# Altium footprint library PcbLib.PcbLib: 428 footprints (part 12 of 27)
Each footprint in its own frame and in the unit in brackets; x right, y up, seen from the top. Pads: shape width x height; smd on the part's side, far side on the other; paste and mask are expansions set on the pad; w line width, h text height; cw(c..) or ccw(c..) is an arc to the next point about the centre after c.
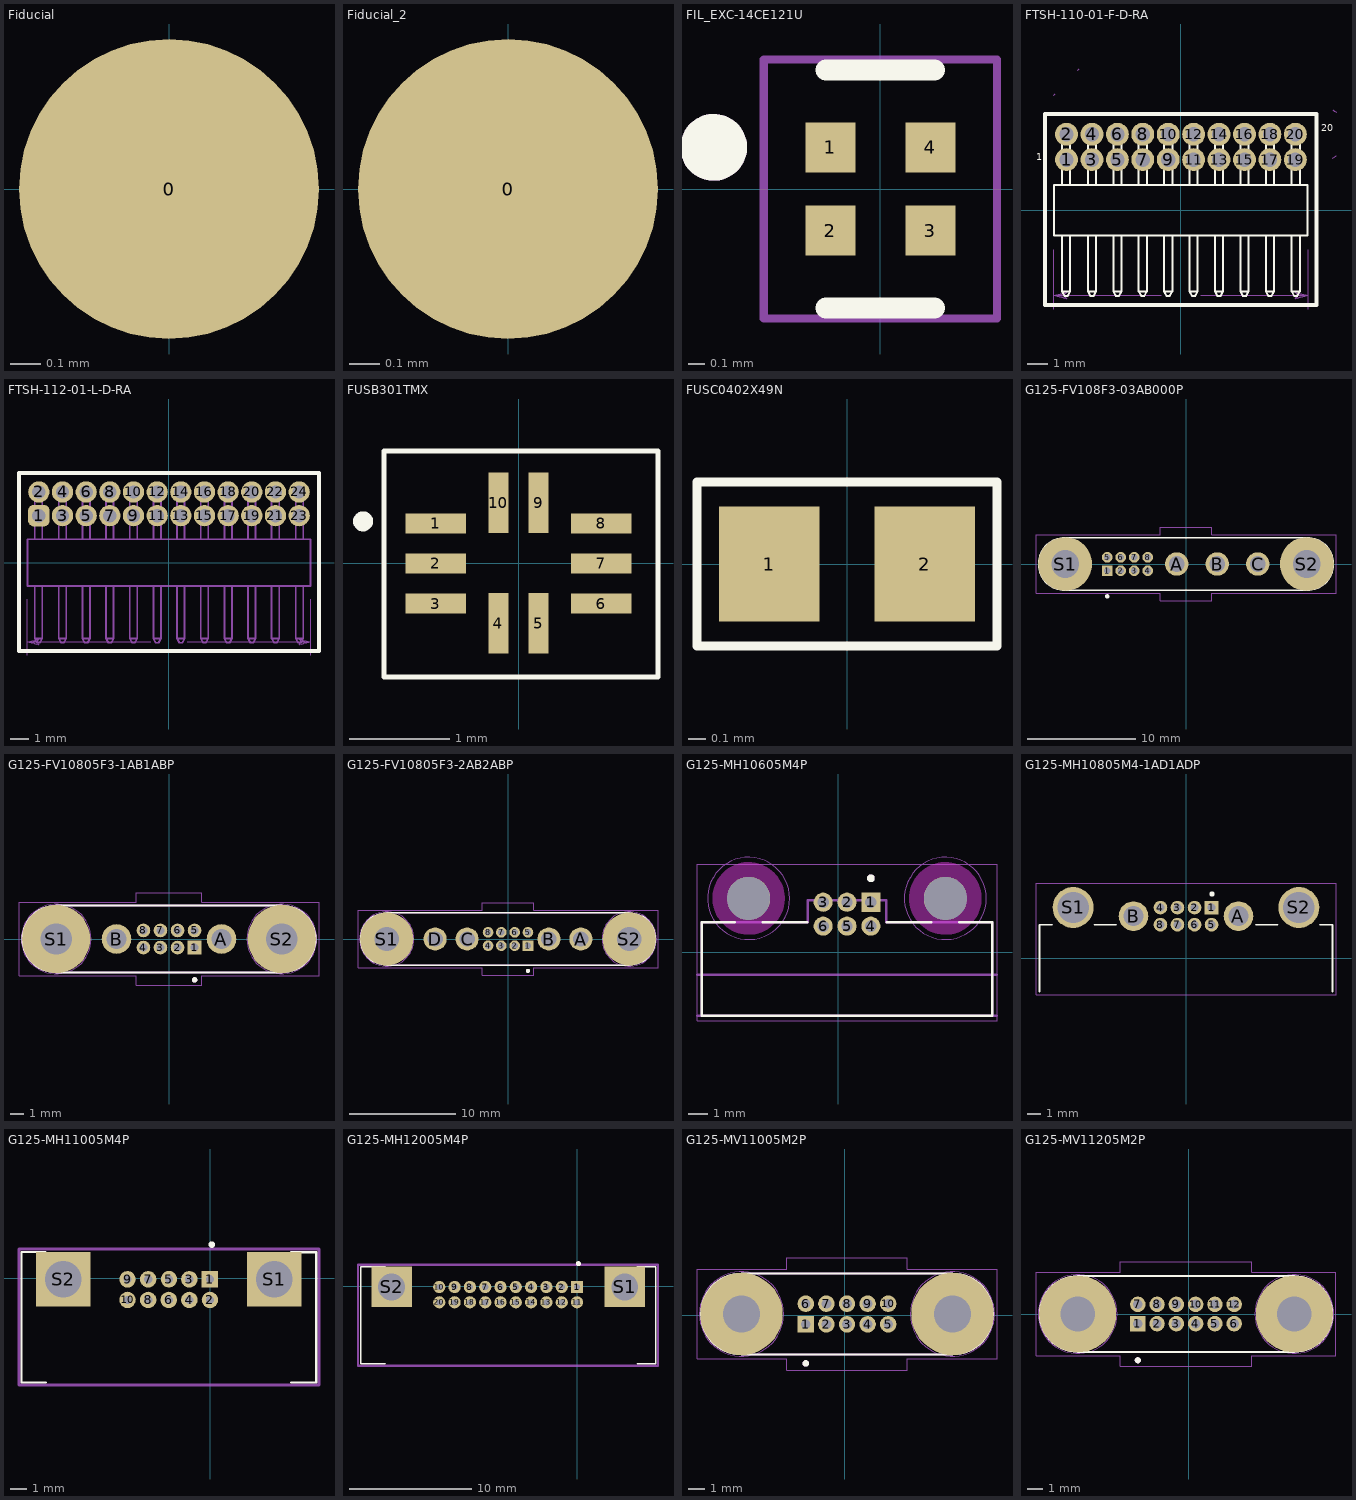
[diagram p11: the footprints below, top view; thin cyan lines are the x and y axes]

## Fiducial [mm]
pads (1):
  round 1 smd mask+0.2: 0(0,0)

## Fiducial_2 [mm]
pads (1):
  round 1 smd mask+0.5: 0(0,0)

## FIL_EXC-14CE121U [mm]
pads (4):
  rect 0.3x0.3 smd: 1(-0.3,0.25) 2(-0.3,-0.25) 3(0.3,-0.25) 4(0.3,0.25)
Top Overlay:
  circle w0.2: c-1,0.25 r0.1
  lines w0.127: -0.325,-0.714 0.325,-0.714 ; -0.325,0.714 0.325,0.714
Mechanical 13:
  circle w0.2: c-1,0.25 r0.1
Mechanical 15:
  lines w0.05: -0.7,-0.777 0.7,-0.777 0.7,0.777 -0.7,0.777 -0.7,-0.777
3D body "step_temp.STEP": height 0.5, standoff 0, extent -0.325,-0.425 0.325,0.425

## FTSH-110-01-F-D-RA [mil]
pads (20):
  round 45 hole 27.95: 1(-225,99.49) 2(-225,149.49) 3(-175,99.49) 4(-175,149.49) 5(-125,99.49) 6(-125,149.49) 7(-75,99.49) 8(-75,149.49) 9(-25,99.49) 10(-25,149.49) 11(25,99.49) 12(25,149.49) 13(75,99.49) 14(75,149.49) 15(125,99.49) 16(125,149.49) 17(175,99.49) 18(175,149.49) 19(225,99.49) 20(225,149.49)
Top Overlay:
  lines w3.94: -233.7,-49.49 -233.7,-160 ; -233.7,49.49 -233.7,157.99 -217.72,157.99 -217.72,49.49 ; -217.72,-49.49 -217.72,-160 ; -200.71,-49.49 -249.21,-49.49 -249.21,49.49 -200.71,49.49 ; -200,-49.49 -150,-49.49 -100,-49.49 -50,-49.49 0,-49.49 50,-49.49 100,-49.49 150,-49.49 200,-49.49 ; -200,49.49 -150,49.49 -100,49.49 -50,49.49 0,49.49 50,49.49 100,49.49 150,49.49 200,49.49 ; -182.99,-49.49 -182.99,-160 ; -182.99,49.49 -182.99,157.99 -167.01,157.99 -167.01,49.49 ; -167.01,-49.49 -167.01,-160 ; -132.99,-49.49 -132.99,-160 ; -132.99,49.49 -132.99,157.99 -117.01,157.99 -117.01,49.49 ; -117.01,-49.49 -117.01,-160 ; -82.99,-49.49 -82.99,-160 ; -82.99,49.49 -82.99,157.99 -67.01,157.99 -67.01,49.49 ; -67.01,-49.49 -67.01,-160 ; -32.99,-49.49 -32.99,-160 ; -32.99,49.49 -32.99,157.99 -17.01,157.99 -17.01,49.49 ; -17.01,-49.49 -17.01,-160 ; 17.01,-49.49 17.01,-160 ; 17.01,49.49 17.01,157.99 32.99,157.99 32.99,49.49 ; 32.99,-49.49 32.99,-160 ; 67.01,-49.49 67.01,-160 ; 67.01,49.49 67.01,157.99 82.99,157.99 82.99,49.49 ; 82.99,-49.49 82.99,-160 ; 117.01,-49.49 117.01,-160 ; 117.01,49.49 117.01,157.99 132.99,157.99 132.99,49.49 ; 132.99,-49.49 132.99,-160 ; 167.01,-49.49 167.01,-160 ; 167.01,49.49 167.01,157.99 182.99,157.99 182.99,49.49 ; 182.99,-49.49 182.99,-160 ; 200.79,-49.49 249.29,-49.49 249.29,49.49 200.79,49.49 ; 217.8,-49.49 217.8,-160 ; 217.8,49.49 217.8,157.99 233.82,157.99 233.82,49.49 ; 233.82,-49.49 233.82,-160 ; -233.7,-160 -228.5,-169.02 -222.91,-169.02 -217.72,-160 ; -233.7,-160 -217.72,-160 ; -182.99,-160 -177.8,-169.02 -172.2,-169.02 -167.01,-160 ; -182.99,-160 -167.01,-160 ; -132.99,-160 -127.8,-169.02 -122.2,-169.02 -117.01,-160 ; -132.99,-160 -117.01,-160 ; -82.99,-160 -77.8,-169.02 -72.2,-169.02 -67.01,-160 ; -82.99,-160 -67.01,-160 ; -32.99,-160 -27.8,-169.02 -22.2,-169.02 -17.01,-160 ; -32.99,-160 -17.01,-160 ; 17.01,-160 22.2,-169.02 27.8,-169.02 32.99,-160 ; 17.01,-160 32.99,-160 ; 67.01,-160 72.2,-169.02 77.8,-169.02 82.99,-160 ; 67.01,-160 82.99,-160 ; 117.01,-160 122.2,-169.02 127.8,-169.02 132.99,-160 ; 117.01,-160 132.99,-160 ; 167.01,-160 172.2,-169.02 177.8,-169.02 182.99,-160 ; 167.01,-160 182.99,-160 ; 217.8,-160 222.99,-169.02 228.58,-169.02 233.82,-160 ; 217.8,-160 233.82,-160
  lines w7.87: -266.93,-186.73 -266.93,189.76 267.01,189.76 267.01,-186.73 -266.93,-186.73
  text "20" at 276,150 h23.62
  text "1" at -285,93 h23.62
Mechanical 40:
  lines w0: -250,-195.12 -250,-77.6 ; -250,226.26 -247.48,229.37 ; -202.52,275.63 -200,278.74 ; -39.02,-167.48 -250,-167.48 ; 39.02,-167.48 250,-167.48 ; 250,-195.12 250,-77.6 ; 298.74,102.52 305,107.48 301.89,105 ; 301.89,195 298.74,197.48 305,192.52 ; -250,-167.48 -225,-161.26 ; -250,-167.48 -225,-173.74 -230,-167.48 ; -250,-167.48 -227.48,-170.63 -230,-167.48 ; -250,-167.48 -230,-167.48 ; -250,-167.48 -227.48,-164.37 -225,-161.26 ; -230,-167.48 -225,-161.26 ; 225,-173.74 250,-167.48 ; 225,-173.74 230,-167.48 ; 225,-173.74 227.48,-170.63 250,-167.48 ; 230,-167.48 225,-161.26 250,-167.48 ; 230,-167.48 227.48,-164.37 250,-167.48 ; 230,-167.48 250,-167.48
  text "12.700" at -31.5,-172.52 h15.5
3D body "FTSH-110-01-F-D-RA--3DModel-STEP-56544.STEP": height 142.3, standoff -82.7, extent -251,-170 249,157

## FTSH-112-01-L-D-RA [mil]
pads (24):
  rrect50% 45x45 hole 27.95: 1(-275,99.49)
  round 45 hole 27.95: 2(-275,149.49) 3(-225,99.49) 4(-225,149.49) 5(-175,99.49) 6(-175,149.49) 7(-125,99.49) 8(-125,149.49) 9(-75,99.49) 10(-75,149.49) 11(-25,99.49) 12(-25,149.49) 13(25,99.49) 14(25,149.49) 15(75,99.49) 16(75,149.49) 17(125,99.49) 18(125,149.49) 19(175,99.49) 20(175,149.49) 21(225,99.49) 22(225,149.49) 23(275,99.49) 24(275,149.49)
Top Overlay:
  lines w7.87: -316.93,-186.73 317.01,-186.73 317.01,189.76 -316.93,189.76 -316.93,-186.73
Top Solder:
  circle w0: c275,149.49 r24.49
  circle w0: c275,99.49 r24.49
  circle w0: c225,149.49 r24.49
  circle w0: c225,99.49 r24.49
  circle w0: c175,149.49 r24.49
  circle w0: c175,99.49 r24.49
  circle w0: c125,149.49 r24.49
  circle w0: c125,99.49 r24.49
  circle w0: c75,149.49 r24.49
  circle w0: c75,99.49 r24.49
  circle w0: c25,149.49 r24.49
  circle w0: c25,99.49 r24.49
  circle w0: c-25,149.49 r24.49
  circle w0: c-25,99.49 r24.49
  circle w0: c-75,149.49 r24.49
  circle w0: c-75,99.49 r24.49
  circle w0: c-125,149.49 r24.49
  circle w0: c-125,99.49 r24.49
  circle w0: c-175,149.49 r24.49
  circle w0: c-175,99.49 r24.49
  circle w0: c-225,149.49 r24.49
  circle w0: c-225,99.49 r24.49
  circle w0: c-275,149.49 r24.49
  circle w0: c-275,99.49 r24.49
Bottom Solder:
  circle w0: c275,149.49 r24.49
  circle w0: c275,99.49 r24.49
  circle w0: c225,149.49 r24.49
  circle w0: c225,99.49 r24.49
  circle w0: c175,149.49 r24.49
  circle w0: c175,99.49 r24.49
  circle w0: c125,149.49 r24.49
  circle w0: c125,99.49 r24.49
  circle w0: c75,149.49 r24.49
  circle w0: c75,99.49 r24.49
  circle w0: c25,149.49 r24.49
  circle w0: c25,99.49 r24.49
  circle w0: c-25,149.49 r24.49
  circle w0: c-25,99.49 r24.49
  circle w0: c-75,149.49 r24.49
  circle w0: c-75,99.49 r24.49
  circle w0: c-125,149.49 r24.49
  circle w0: c-125,99.49 r24.49
  circle w0: c-175,149.49 r24.49
  circle w0: c-175,99.49 r24.49
  circle w0: c-225,149.49 r24.49
  circle w0: c-225,99.49 r24.49
  circle w0: c-275,149.49 r24.49
  circle w0: c-275,99.49 r24.49
Mechanical 16:
  lines w3.94: -283.7,-49.49 -283.7,-160 ; -283.7,49.49 -283.7,157.99 -267.72,157.99 -267.72,49.49 ; -267.72,-49.49 -267.72,-160 ; -250.71,-49.49 -299.21,-49.49 -299.21,49.49 -250.71,49.49 ; -250,-49.49 -200,-49.49 -150,-49.49 -100,-49.49 -50,-49.49 0,-49.49 50,-49.49 100,-49.49 150,-49.49 200,-49.49 250,-49.49 ; -250,49.49 -200,49.49 -150,49.49 -100,49.49 -50,49.49 0,49.49 50,49.49 100,49.49 150,49.49 200,49.49 250,49.49 ; -232.99,-49.49 -232.99,-160 ; -232.99,49.49 -232.99,157.99 -217.01,157.99 -217.01,49.49 ; -217.01,-49.49 -217.01,-160 ; -182.99,-49.49 -182.99,-160 ; -182.99,49.49 -182.99,157.99 -167.01,157.99 -167.01,49.49 ; -167.01,-49.49 -167.01,-160 ; -132.99,-49.49 -132.99,-160 ; -132.99,49.49 -132.99,157.99 -117.01,157.99 -117.01,49.49 ; -117.01,-49.49 -117.01,-160 ; -82.99,-49.49 -82.99,-160 ; -82.99,49.49 -82.99,157.99 -67.01,157.99 -67.01,49.49 ; -67.01,-49.49 -67.01,-160 ; -32.99,-49.49 -32.99,-160 ; -32.99,49.49 -32.99,157.99 -17.01,157.99 -17.01,49.49 ; -17.01,-49.49 -17.01,-160 ; 17.01,-49.49 17.01,-160 ; 17.01,49.49 17.01,157.99 32.99,157.99 32.99,49.49 ; 32.99,-49.49 32.99,-160 ; 67.01,-49.49 67.01,-160 ; 67.01,49.49 67.01,157.99 82.99,157.99 82.99,49.49 ; 82.99,-49.49 82.99,-160 ; 117.01,-49.49 117.01,-160 ; 117.01,49.49 117.01,157.99 132.99,157.99 132.99,49.49 ; 132.99,-49.49 132.99,-160 ; 167.01,-49.49 167.01,-160 ; 167.01,49.49 167.01,157.99 182.99,157.99 182.99,49.49 ; 182.99,-49.49 182.99,-160 ; 217.01,-49.49 217.01,-160 ; 217.01,49.49 217.01,157.99 232.99,157.99 232.99,49.49 ; 232.99,-49.49 232.99,-160 ; 250.79,-49.49 299.29,-49.49 299.29,49.49 250.79,49.49 ; 267.8,-49.49 267.8,-160 ; 267.8,49.49 267.8,157.99 283.82,157.99 283.82,49.49 ; 283.82,-49.49 283.82,-160 ; -283.7,-160 -278.5,-169.02 -272.91,-169.02 -267.72,-160 ; -283.7,-160 -267.72,-160 ; -232.99,-160 -227.8,-169.02 -222.2,-169.02 -217.01,-160 ; -232.99,-160 -217.01,-160 ; -182.99,-160 -177.8,-169.02 -172.2,-169.02 -167.01,-160 ; -182.99,-160 -167.01,-160 ; -132.99,-160 -127.8,-169.02 -122.2,-169.02 -117.01,-160 ; -132.99,-160 -117.01,-160 ; -82.99,-160 -77.8,-169.02 -72.2,-169.02 -67.01,-160 ; -82.99,-160 -67.01,-160 ; -32.99,-160 -27.8,-169.02 -22.2,-169.02 -17.01,-160 ; -32.99,-160 -17.01,-160 ; 17.01,-160 22.2,-169.02 27.8,-169.02 32.99,-160 ; 17.01,-160 32.99,-160 ; 67.01,-160 72.2,-169.02 77.8,-169.02 82.99,-160 ; 67.01,-160 82.99,-160 ; 117.01,-160 122.2,-169.02 127.8,-169.02 132.99,-160 ; 117.01,-160 132.99,-160 ; 167.01,-160 172.2,-169.02 177.8,-169.02 182.99,-160 ; 167.01,-160 182.99,-160 ; 217.01,-160 222.2,-169.02 227.8,-169.02 232.99,-160 ; 217.01,-160 232.99,-160 ; 267.8,-160 272.99,-169.02 278.58,-169.02 283.82,-160 ; 267.8,-160 283.82,-160
Mechanical 40:
  lines w0: -300,-195.12 -300,-77.6 ; -39.02,-167.48 -300,-167.48 ; 39.02,-167.48 300,-167.48 ; 300,-195.12 300,-77.6 ; -300,-167.48 -277.48,-164.37 -275,-161.26 ; -300,-167.48 -280,-167.48 ; -300,-167.48 -277.48,-170.63 -280,-167.48 ; -300,-167.48 -275,-173.74 -280,-167.48 ; -300,-167.48 -275,-161.26 ; -280,-167.48 -275,-161.26 ; 275,-173.74 277.48,-170.63 300,-167.48 ; 275,-173.74 280,-167.48 ; 275,-173.74 300,-167.48 ; 280,-167.48 300,-167.48 ; 280,-167.48 277.48,-164.37 300,-167.48 ; 280,-167.48 275,-161.26 300,-167.48
  text "15.240" at -31.5,-172.52 h15.5
3D body "FTSH-112-01-L-D-RA--3DModel-STEP-56544.STEP": height 147.5, standoff -77.5, extent -300,-169 300,158

## FUSB301TMX [mm]
height 0.37
pads (10):
  rect 0.6x0.2 smd: 1(-0.825,0.4) 2(-0.825,0) 3(-0.825,-0.4) 6(0.825,-0.4) 7(0.825,0) 8(0.825,0.4)
  rect 0.2x0.6 smd: 4(-0.2,-0.595) 5(0.2,-0.595) 9(0.2,0.605) 10(-0.2,0.605)
Top Overlay:
  circle w0.1: c-1.55,0.42 r0.05
  lines w0.05: -1.34,-1.13 -1.34,1.12 1.39,1.12 1.39,-1.13 -1.34,-1.13
3D body "PQFN40P160X120X37-10N.step": height 0.37, standoff 0, extent -0.8,-0.6 0.8,0.6

## FUSC0402X49N [mm]
pads (2):
  rect 0.56x0.64 smd: 1(-0.435,0) 2(0.435,0)
Top Overlay:
  lines w0.05: -0.838,-0.457 0.838,-0.457 0.838,0.457 -0.838,0.457 -0.838,-0.457
3D body "step_temp.STEP": height 0.49, standoff 0, extent -0.5,-0.25 0.5,0.25

## G125-FV108F3-03AB000P [mm]
height 5.25
pads (13):
  rect 1x1 / inner round 1 / far side rect 1x1 hole 0.6: 1(-7.3,-0.625)
  round 1 hole 0.6: 2(-6.05,-0.625) 3(-4.8,-0.625) 4(-3.55,-0.625) 5(-7.3,0.625) 6(-6.05,0.625) 7(-4.8,0.625) 8(-3.55,0.625)
  round 2.175 hole 1.45: A(-0.85,0) B(2.9,0) C(6.65,0)
  round 5 hole 2.55: S1(-11.2,0) S2(11.2,0)
Top Overlay:
  circle w0.2: c-7.3,-3 r0.1
  lines w0.127: -13.65,0 cw(c-11.2,0) -11.2,2.45 11.2,2.45 cw(c11.2,0) 13.65,0 cw(c11.2,0) 11.2,-2.45 -11.2,-2.45 cw(c-11.2,0) -13.65,0
Mechanical 15:
  lines w0.05: -13.9,-2.7 -2.4,-2.7 -2.4,-3.4 2.4,-3.4 2.4,-2.7 13.9,-2.7 13.9,2.7 2.4,2.7 2.4,3.4 -2.4,3.4 -2.4,2.7 -13.9,2.7 -13.9,-2.7
3D body "g125-fv108f3-03ab000p.stp": height 5.4, standoff -4.85, extent -13.65,-2.487 13.65,2.413

## G125-FV10805F3-1AB1ABP [mm]
height 5.25
pads (12):
  rect 1x1 / inner round 1 / far side rect 1x1 hole 0.6: 1(1.875,-0.625)
  round 1 hole 0.6: 2(0.625,-0.625) 3(-0.625,-0.625) 4(-1.875,-0.625) 5(1.875,0.625) 6(0.625,0.625) 7(-0.625,0.625) 8(-1.875,0.625)
  round 2.175 hole 1.45: A(3.85,0) B(-3.85,0)
  round 5 hole 2.3: S1(-8.275,0) S2(8.275,0)
Top Overlay:
  circle w0.2: c1.875,-3 r0.1
  lines w0.127: -10.75,0 cw(c-8.3,0) -8.3,2.45 8.3,2.45 cw(c8.3,0) 10.75,0 cw(c8.3,0) 8.3,-2.45 -8.3,-2.45 cw(c-8.3,0) -10.75,0
Mechanical 13:
  circle w0.2: c1.875,-3 r0.1
  lines w0.127: -10.75,0 cw(c-8.3,0) -8.3,2.45 8.3,2.45 cw(c8.3,0) 10.75,0 cw(c8.3,0) 8.3,-2.45 -8.3,-2.45 cw(c-8.3,0) -10.75,0
Mechanical 15:
  lines w0.05: -11,-2.7 -2.4,-2.7 -2.4,-3.4 2.4,-3.4 2.4,-2.7 11,-2.7 11,2.7 2.4,2.7 2.4,3.4 -2.4,3.4 -2.4,2.7 -11,2.7 -11,-2.7
Mechanical 16:
  circle w0.05: c8.275,0 r2.56
  circle w0.05: c-8.275,0 r2.56
3D body "g125-fv10805f3-1ab1abp.stp": height 5.5, standoff -4.75, extent -10.725,-2.487 10.725,2.413

## G125-FV10805F3-2AB2ABP [mm]
height 5.25
pads (14):
  rect 1x1 / inner round 1 / far side rect 1x1 hole 0.6: 1(1.875,-0.625)
  round 1 hole 0.6: 2(0.625,-0.625) 3(-0.625,-0.625) 4(-1.875,-0.625) 5(1.875,0.625) 6(0.625,0.625) 7(-0.625,0.625) 8(-1.875,0.625)
  round 2.175 hole 1.45: A(6.85,0) B(3.85,0) C(-3.85,0) D(-6.85,0)
  round 5 hole 2.3 unplated: S1(-11.4,0) S2(11.4,0)
Top Overlay:
  circle w0.2: c1.875,-3 r0.1
  lines w0.127: -13.85,0 cw(c-11.4,0) -11.4,2.45 11.4,2.45 cw(c11.4,0) 13.85,0 cw(c11.4,0) 11.4,-2.45 -11.4,-2.45 cw(c-11.4,0) -13.85,0
Mechanical 13:
  circle w0.2: c1.875,-3 r0.1
  lines w0.127: -13.85,0 cw(c-11.4,0) -11.4,2.45 11.4,2.45 cw(c11.4,0) 13.85,0 cw(c11.4,0) 11.4,-2.45 -11.4,-2.45 cw(c-11.4,0) -13.85,0
Mechanical 15:
  lines w0.05: -14.1,-2.7 -2.4,-2.7 -2.4,-3.4 2.4,-3.4 2.4,-2.7 14.1,-2.7 14.1,2.7 2.4,2.7 2.4,3.4 -2.4,3.4 -2.4,2.7 -14.1,2.7 -14.1,-2.7
Mechanical 16:
  circle w0.05: c11.4,0 r2.56
  circle w0.05: c-11.4,0 r2.56
3D body "g125-fv10805f3-2ab2abp.stp": height 5.5, standoff -4.75, extent -13.895,-2.427 13.805,2.473

## G125-MH10605M4P [mm] "HARWIN 3+3 position MALE screw-lock board mount"
pads (8):
  rect 1x1 / inner round 1 / far side rect 1x1 hole 0.6: 1(1.704,2.61)
  round 1 hole 0.6: 2(0.454,2.61) 3(-0.796,2.61) 4(1.704,1.36) 5(0.454,1.36) 6(-0.796,1.36)
  round 2.25 hole 2.25 unplated: ""(-4.696,2.81) ""(5.604,2.81)
Top Overlay:
  circle w0.2: c1.704,3.86 r0.1
  lines w0.127: -5.426,1.56 -7.146,1.56 -7.146,-3.34 8.054,-3.34 8.054,1.56 6.334,1.56 ; -3.966,1.56 -1.616,1.56 ; 2.524,1.56 4.874,1.56
Keep-Out Layer:
  circle w1.9: c5.604,2.81 r0.95
  circle w1.9: c5.604,2.81 r0.95
  circle w1.9: c-4.696,2.81 r0.95
  circle w1.9: c-4.696,2.81 r0.95
Mechanical 13:
  circle w0.2: c1.704,3.86 r0.1
  lines w0.127: -7.396,-3.34 8.304,-3.34 ; -7.396,-1.19 8.304,-1.19 ; -7.146,-3.34 8.054,-3.34 8.054,1.56 2.504,1.56 2.504,2.71 -1.596,2.71 -1.596,1.56 -7.146,1.56 -7.146,-3.34
  text "PCB edge for Unshielded Cable" at -7.046,-4.64 h0.81
  text "PCB edge for Shielded Cable" at -7.046,-2.14 h0.81
Mechanical 15:
  lines w0.05: -7.396,-3.59 -7.396,4.61 8.304,4.61 8.304,-3.59 -7.396,-3.59
Mechanical 16:
  circle w0.05: c5.604,2.81 r2.15
  circle w0.05: c-4.696,2.81 r2.15
3D body "step_temp.STEP": height 5.25, standoff -3.3, extent -7.146,-3.34 8.054,4.36

## G125-MH10805M4-1AD1ADP [mm]
height 5.3
pads (12):
  rect 1x1 / inner round 1 / far side rect 1x1 hole 0.6: 1(1.875,3.7)
  round 1 hole 0.6: 2(0.625,3.7) 3(-0.625,3.7) 4(-1.875,3.7) 5(1.875,2.45) 6(0.625,2.45) 7(-0.625,2.45) 8(-1.875,2.45)
  round 2.175 hole 1.45: A(3.85,3.08) B(-3.85,3.08)
  round 3 hole 2.3 unplated: S1(-8.275,3.71) S2(8.275,3.71)
Top Overlay:
  circle w0.2: c1.905,4.699 r0.1
  lines w0.127: -10.75,-2.45 -10.75,2.45 -9.825,2.45 ; -6.725,2.45 -5.125,2.45 ; 5.125,2.45 6.725,2.45 ; 9.825,2.45 10.75,2.45 10.75,-2.45
Mechanical 15:
  lines w0.05: -11,-2.7 -11,5.5 11,5.5 11,-2.7 -11,-2.7
3D body "g125-mh10805m4-1ad1adp.stp": height 5.45, standoff -3.3, extent -10.782,-2.453 10.668,5.247

## G125-MH11005M4P [mm]
pads (12):
  rect 1x1 hole 0.5: 1(-0.013,-0.06)
  round 1 hole 0.5: 2(-0.013,-1.31) 3(-1.263,-0.06) 4(-1.263,-1.31) 5(-2.5,-0.05) 6(-2.513,-1.31) 7(-3.763,-0.06) 8(-3.763,-1.31) 9(-5.013,-0.06) 10(-5.013,-1.31)
  rect 3.302x3.302 hole 2.2: S1(3.886,-0.051) S2(-8.914,-0.051)
Top Overlay:
  circle w0.2: c0.1,2.05 r0.1
  lines w0.127: -10,1.588 -11.441,1.588 -11.441,-6.316 -9.95,-6.316 ; 4.918,-6.319 6.436,-6.319 6.436,1.583 4.918,1.583
Mechanical 15:
  lines w0.2: -11.6,-6.477 -11.6,1.778 6.604,1.778 6.604,-6.477 -11.6,-6.477
3D body "g125-mh11005m4_asm.stp": height 5.26, standoff -3.29, extent -11.35,-6.2 6.35,1.5

## G125-MH12005M4P [mm]
pads (22):
  rect 1x1 hole 0.5: 1(-0.013,-0.06)
  round 1 hole 0.5: 2(-1.263,-0.06) 3(-2.513,-0.06) 4(-3.763,-0.06) 5(-5.013,-0.06) 6(-6.263,-0.06) 7(-7.513,-0.06) 8(-8.763,-0.06) 9(-10.013,-0.06) 10(-11.263,-0.06) 11(-0.013,-1.31) 12(-1.263,-1.31) 13(-2.513,-1.31) 14(-3.763,-1.31) 15(-5.013,-1.31) 16(-6.263,-1.31) 17(-7.513,-1.31) 18(-8.763,-1.31) 19(-10.013,-1.31) 20(-11.263,-1.31)
  rect 3.302x3.302 hole 2.2: S1(3.886,-0.051) S2(-15.164,-0.051)
Top Overlay:
  circle w0.2: c0.1,1.85 r0.1
  lines w0.127: -15.682,-6.316 -17.691,-6.316 -17.691,1.588 -15.682,1.588 ; 4.918,-6.319 6.436,-6.319 6.436,1.583 4.918,1.583
Mechanical 15:
  lines w0.2: -17.907,-6.477 6.604,-6.477 6.604,1.778 -17.907,1.778 -17.907,-6.477
3D body "g125-mh12005m4_asm.stp": height 5.36, standoff -3.19, extent -17.615,-6.214 6.335,1.486

## G125-MV11005M2P [mm] "HARWIN Male Vertical Connector, 1.25mm Pitch, 5+5 Contacts"
pads (12):
  rect 1x1 / inner round 1 / far side rect 1x1 hole 0.6: 1(-2.363,-0.55)
  round 1 hole 0.6: 2(-1.113,-0.55) 3(0.137,-0.55) 4(1.387,-0.55) 5(2.637,-0.55) 6(-2.363,0.7) 7(-1.113,0.7) 8(0.137,0.7) 9(1.387,0.7) 10(2.637,0.7)
  round 5 hole 2.25 unplated: ""(-6.263,0.075) ""(6.537,0.075)
Top Overlay:
  circle w0.2: c-2.363,-2.925 r0.1
  lines w0.127: -8.713,0.075 cw(c-6.263,0.075) -6.263,2.525 6.537,2.525 cw(c6.537,0.075) 8.987,0.075 cw(c6.537,0.075) 6.537,-2.375 -6.263,-2.375 cw(c-6.263,0.075) -8.713,0.075
Mechanical 13:
  circle w0.2: c-2.363,-2.925 r0.1
  lines w0.127: -8.713,0.075 cw(c-6.263,0.075) -6.263,2.525 6.537,2.525 cw(c6.537,0.075) 8.987,0.075 cw(c6.537,0.075) 6.537,-2.375 -6.263,-2.375 cw(c-6.263,0.075) -8.713,0.075
Mechanical 15:
  lines w0.05: -8.963,-2.625 -3.513,-2.625 -3.513,-3.325 3.787,-3.325 3.787,-2.625 9.237,-2.625 9.237,2.775 3.787,2.775 3.787,3.475 -3.513,3.475 -3.513,2.775 -8.963,2.775 -8.963,-2.625
Mechanical 16:
  circle w0.05: c6.537,0.075 r2.56
  circle w0.05: c-6.263,0.075 r2.56
3D body "G125-MV11005M2_asm.stp": height 3, standoff -6.9, extent -8.76,-2.387 8.94,2.513

## G125-MV11205M2P [mm] "HARWIN Male vertical Connector, 1.25mm pitch, 6+6 contacts"
pads (14):
  rect 1x1 / inner round 1 / far side rect 1x1 hole 0.6: 1(-3.303,-0.616)
  round 1 hole 0.6: 2(-2.053,-0.616) 3(-0.803,-0.616) 4(0.447,-0.616) 5(1.697,-0.616) 6(2.947,-0.616) 7(-3.303,0.634) 8(-2.053,0.634) 9(-0.803,0.634) 10(0.447,0.634) 11(1.697,0.634) 12(2.947,0.634)
  round 5 hole 2.25 unplated: ""(-7.203,0.009) ""(6.847,0.009)
Top Overlay:
  circle w0.2: c-3.303,-2.991 r0.1
  lines w0.127: -9.653,0.009 cw(c-7.203,0.009) -7.203,2.459 6.847,2.459 cw(c6.847,0.009) 9.297,0.009 cw(c6.847,0.009) 6.847,-2.441 -7.203,-2.441 cw(c-7.203,0.009) -9.653,0.009
Mechanical 13:
  circle w0.2: c-3.303,-2.991 r0.1
  lines w0.127: -9.653,0.009 cw(c-7.203,0.009) -7.203,2.459 6.847,2.459 cw(c6.847,0.009) 9.297,0.009 cw(c6.847,0.009) 6.847,-2.441 -7.203,-2.441 cw(c-7.203,0.009) -9.653,0.009
Mechanical 15:
  lines w0.05: -9.903,-2.691 -4.453,-2.691 -4.453,-3.391 4.097,-3.391 4.097,-2.691 9.547,-2.691 9.547,2.709 4.097,2.709 4.097,3.409 -4.453,3.409 -4.453,2.709 -9.903,2.709 -9.903,-2.691
Mechanical 16:
  circle w0.05: c6.847,0.009 r2.56
  circle w0.05: c-7.203,0.009 r2.56
3D body "g125-mv11205m2p.stp": height 3, standoff -6.9, extent -9.574,-2.441 9.376,2.459